# Altium footprint library cool_library.PcbLib: 1182 footprints (part 30 of 75)
Each footprint in its own frame and in the unit in brackets; x right, y up, seen from the top. Pads: shape width x height; smd on the part's side, far side on the other; paste and mask are expansions set on the pad; w line width, h text height; cw(c..) or ccw(c..) is an arc to the next point about the centre after c.
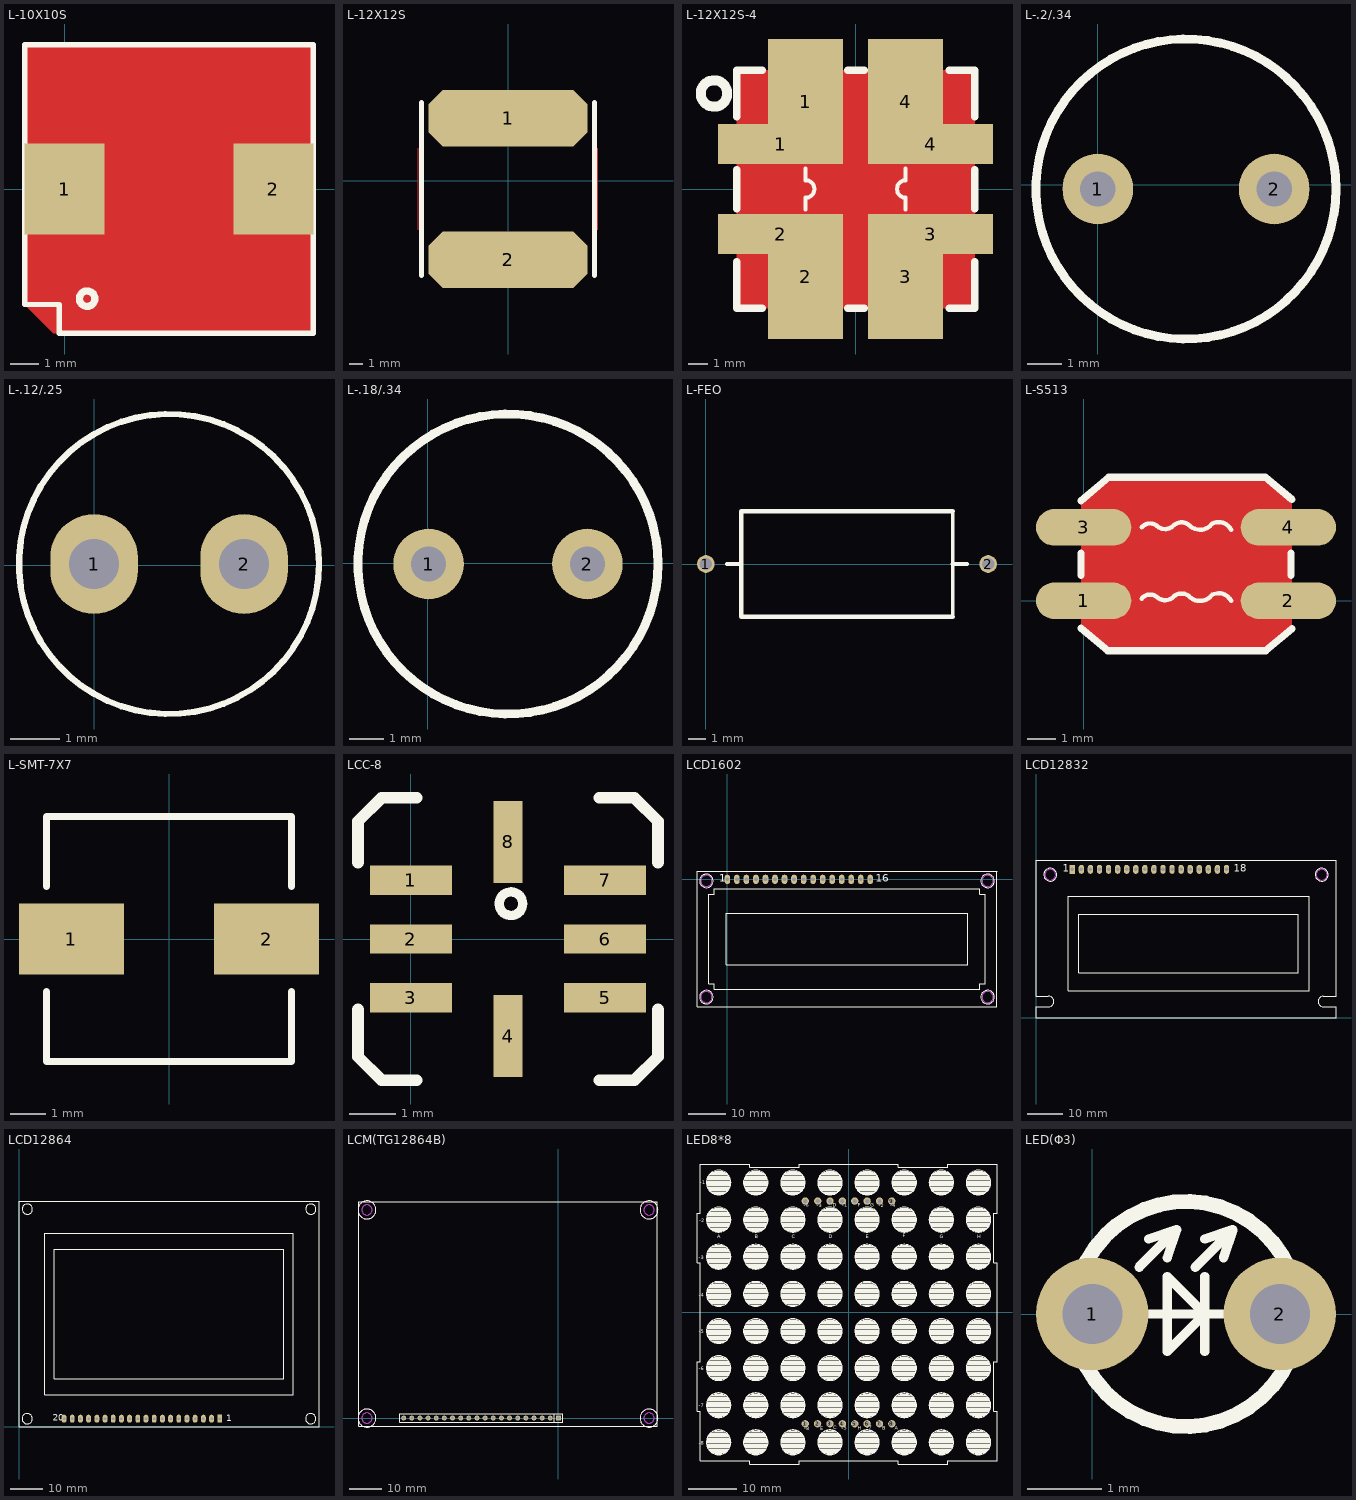
[diagram p29: the footprints below, top view; thin cyan lines are the x and y axes]

## L-10X10S [mm]
pads (2):
  rect 2.8x3.2 smd: 1(0,0) 2(7.3,0)
Top Layer:
  pour cut-out: -1.4,5.05 8.7,5.05 8.7,-5.05 -0.393,-5.05 -1.4,-4.043
Top Overlay:
  circle w0.254: c0.784,-3.84 r0.27
  lines w0.178: -1.4,-4.043 -1.4,5.05 8.7,5.05 8.7,-5.05 -0.19,-5.05 -0.19,-4.043 -1.4,-4.043

## L-12X12S [mil]
pads (2):
  oct 450x160 smd: 1(0,177) 2(0,-223)
Top Layer:
  lines w2: -254,-138 -254,92 ; 254,-138 254,92
Top Overlay:
  lines w15: -245,-268 -245,222 ; 245,-268 245,222

## L-12X12S-4 [mil]
pads (8):
  rect 250x80 smd: 1(-150,90) 2(-150,-90) 3(150,-90) 4(150,90)
  rect 150x250 smd: 1(-100,175) 2(-100,-175) 3(100,-175) 4(100,175)
Top Layer:
  pour cut-out: -238,238 238,238 238,-238 -238,-238
Top Overlay:
  circle w20: c-283.48,191 r26.48
  lines w8: -100,-41.46 -100,-17.46 ccw(c-100,0) -100,17.46 -100,41.46 ; 100,-41.46 100,-17.46 cw(c100,0) 100,17.46 100,41.46
  lines w15: -238,-145 -238,-238 -187,-238 ; -238,-39 -238,39 ; -238,145 -238,238 -187,238 ; -16,-238 17,-238 ; -16,238 17,238 ; 187,-238 238,-238 238,-145 ; 187,238 238,238 238,145 ; 238,-39 238,39

## L-.2/.34 [mil]
pads (2):
  round 80 hole 40: 1(0,-5) 2(200,-5)
Top Overlay:
  circle w10: c100,-5 r170

## L-.12/.25 [mil]
pads (2):
  oval 70x80 hole 40: 1(0,1) 2(120,1)
Top Overlay:
  circle w5: c60,1 r120

## L-.18/.34 [mil]
pads (2):
  round 80 hole 40: 1(1,-1) 2(181,-1)
Top Overlay:
  circle w10: c91,-1 r170

## L-FEO [mm]
pads (2):
  round 1 hole 0.7: 1(0,0) 2(16,0)
Top Overlay:
  lines w0.2: 14,-3 14,3
  lines w0.254: 1.2,0 2,0 ; 14,-3 2,-3 2,3 14,3 ; 14,0 14.8,0

## L-S513 [mil]
pads (4):
  oval 130x50 smd: 1(0,0) 2(279,0) 3(0,100) 4(279,100)
Top Layer:
  pour cut-out: -3.59,136.41 34.22,168.22 247.78,168.22 284,138 284,-38 248,-68 33,-68 -3.59,-37.41
Top Overlay:
  lines w6: 79,3 cw(c90.5,-6.5) 100,5 ccw(c111,17) 123,6 cw(c133.5,-6.5) 146,4 ccw(c158.5,20.5) 175,8 cw(c184,-9) 201,0 ; 79,100 cw(c90.5,90.5) 100,102 ccw(c111,114) 123,103 cw(c133.5,90.5) 146,101 ccw(c158.5,117.5) 175,105 cw(c184,88) 201,97
  lines w10: -3.59,35 -3.59,65 ; 49,-68 33,-68 ; 55,168.22 34.22,168.22 ; 235,-68 248,-68 ; 237,168.22 247.78,168.22 ; 238,-68 248,-68 ; 282.59,35 282.59,65 ; 33,-68 -3.59,-37.41 33,-68 ; 33,-68 248,-68 ; 34.22,168.22 -3.59,136.41 34.22,168.22 ; 34.22,168.22 247.78,168.22 ; 247.78,168.22 284,138 247.78,168.22 ; 248,-68 284,-38 248,-68

## L-SMT-7X7 [mil]
height 324
pads (2):
  rect 118.11x80 smd: 1(-110,0) 2(110,0)
Top Overlay:
  lines w7.87: -137.79,-59.05 -137.79,-137.79 137.8,-137.79 137.8,-59.05 ; -137.79,59.06 -137.79,137.8 137.8,137.8 137.8,59.06

## LCC-8 [mil]
pads (8):
  rect 70x25 smd: 1(0,50) 2(0,0) 3(0,-50) 5(165,-50) 6(165,0) 7(165,50)
  rect 25x70 smd: 4(82.5,-82.5) 8(82.5,82.5)
Top Overlay:
  circle w8: c85,30 r10
  lines w10: -45,-60 -45,-100 -25,-120 5,-120 ; -45,65 -45,100 -25,120 5,120 ; 160,-120 190,-120 210,-100 210,-60 ; 160,120 190,120 210,100 210,65

## LCD1602 [mm]
pads (16):
  oval 1.5x2.5 hole 1: 1(0,0) 2(2.54,0) 3(5.08,0) 4(7.62,0) 5(10.16,0) 6(12.7,0) 7(15.24,0) 8(17.78,0) 9(20.32,0) 10(22.86,0) 11(25.4,0) 12(27.94,0) 13(30.48,0) 14(33.02,0) 15(35.56,0) 16(38.1,0)
Top Overlay:
  circle w0.2: c69.4,-0.4 r1.8
  circle w0.2: c69.4,-31.4 r1.8
  circle w0.2: c-5.6,-0.4 r1.8
  circle w0.2: c-5.6,-31.4 r1.8
  lines w0.203: -8.1,-33.9 -8.1,2.1 71.9,2.1 71.9,-33.9 -8.1,-33.9 ; -4.95,-27.8 -3.45,-27.8 -3.45,-29.3 67.25,-29.3 67.25,-27.8 68.75,-27.8 68.75,-4 67.25,-4 67.25,-2.5 -3.45,-2.5 -3.45,-4 -4.95,-4 -4.95,-27.8 ; -0.35,-22.8 -0.35,-9 64.15,-9 64.15,-22.8 -0.35,-22.8
  text "16" at 39.525,-0.694 h2
  text "1" at -2.131,-0.694 h2
Keep-Out Layer:
  circle w0.2: c69.4,-0.4 r1.5
  circle w0.2: c69.4,-31.4 r1.5
  circle w0.2: c-5.6,-0.4 r1.5
  circle w0.2: c-5.6,-31.4 r1.5
Mechanical 1:
  circle w0.2: c69.4,-0.4 r1.5
  circle w0.2: c69.4,-31.4 r1.5
  circle w0.2: c-5.6,-31.4 r1.5
  circle w0.2: c-5.6,-0.4 r1.5

## LCD12832 [mm]
pads (18):
  rect 1.5x2.5 hole 1: 1(10.16,41.5)
  oval 1.5x2.5 hole 1: 2(12.7,41.5) 3(15.24,41.5) 4(17.78,41.5) 5(20.32,41.5) 6(22.86,41.5) 7(25.4,41.5) 8(27.94,41.5) 9(30.48,41.5) 10(33.02,41.5) 11(35.56,41.5) 12(38.1,41.5) 13(40.64,41.5) 14(43.18,41.5) 15(45.72,41.5) 16(48.26,41.5) 17(50.8,41.5) 18(53.34,41.5)
Top Overlay:
  circle w0.254: c4,40 r1.8
  circle w0.254: c80,40 r1.8
  lines w0.203: 3.5,3 0,3 0,0 84,0 84,3 80.5,3 ; 3.5,6 0,6 0,44 84,44 84,6 80.5,6 ; 76.5,33.936 76.5,7.5 9,7.5 9,34 76.5,34 ; 12,12.5 73.5,12.5 73.5,29 12,29 12,12.5
  lines w0.254: 3.5,3 ccw(c3.5,4.5) 3.5,6 ; 80.5,3 cw(c80.5,4.5) 80.5,6
  text "1" at 7.493,40.894 h2
  text "18" at 55.372,40.894 h2
Keep-Out Layer:
  circle w0.254: c4,40 r1.5
  circle w0.254: c80,40 r1.5
Mechanical 1:
  circle w0.254: c4,40 r1.5
  circle w0.254: c80,40 r1.5

## LCD12864 [mm]
pads (20):
  rect 1.5x2.5 hole 0.8: 1(62.228,2.54)
  oval 1.5x2.5 hole 0.8: 2(59.688,2.54) 3(57.148,2.54) 4(54.608,2.54) 5(52.068,2.54) 6(49.528,2.54) 7(46.988,2.54) 8(44.448,2.54) 9(41.908,2.54) 10(39.368,2.54) 11(36.828,2.54) 12(34.288,2.54) 13(31.748,2.54) 14(29.208,2.54) 15(26.668,2.54) 16(24.128,2.54) 17(21.588,2.54) 18(19.048,2.54) 19(16.508,2.54) 20(13.968,2.54)
Top Overlay:
  lines w0.203: 0,0 93,0 93,70 0,70 0,0 ; 8,10 8,60 85,60 85,10 8,10 ; 11,15 11,55 82,55 82,15 11,15
  lines w0.254: 4.139,2.498 cw(c2.54,2.54) 4.14,2.54 ; 4.179,67.458 cw(c2.58,67.5) 4.18,67.5 ; 92.023,2.498 cw(c90.424,2.54) 92.024,2.54 ; 92.063,67.458 cw(c90.464,67.5) 92.064,67.5
  text "20" at 10.414,1.905 h2
  text "1" at 64.262,1.778 h2

## LCM(TG12864B) [mil]
pads (20):
  rect 60x60 hole 36: 1(0,0)
  round 60 hole 36: 2(-100,0) 3(-200,0) 4(-300,0) 5(-400,0) 6(-500,0) 7(-600,0) 8(-700,0) 9(-800,0) 10(-900,0) 11(-1000,0) 12(-1100,0) 13(-1200,0) 14(-1300,0) 15(-1400,0) 16(-1500,0) 17(-1600,0) 18(-1700,0) 19(-1800,0) 20(-1900,0)
Top Overlay:
  circle w10: c1112,-1 r110.24
  circle w10: c-2350,-1 r110.24
  circle w10: c1112,2555 r110.24
  circle w10: c-2350,2555 r110.24
  lines w8: -2450,-101 1212,-101 1212,2655 -2450,2655 -2450,-101
  lines w10: -50,-50 -50,50 ; -1950,-50 -1950,50 50,50 50,-50 -1950,-50
Keep-Out Layer:
  circle w10: c-2350,2555 r110.24
  circle w10: c-2350,-1 r110.24
  circle w10: c1112,-1 r110.24
  circle w10: c1112,2555 r110.24
  circle w10: c-2350,2555 r62.99
  circle w10: c-2350,-1 r62.99
  circle w10: c1112,-1 r62.99
  circle w10: c1112,2555 r62.99
Mechanical 1:
  circle w10: c-2350,2555 r62.99
  circle w10: c-2350,-1 r62.99
  circle w10: c1112,-1 r62.99
  circle w10: c1112,2555 r62.99

## LED8*8 [mm]
pads (16):
  round 1.5 hole 0.9: 1(-8.89,-22.86) 2(-6.35,-22.86) 3(-3.81,-22.86) 4(-1.27,-22.86) 5(1.27,-22.86) 6(3.81,-22.86) 7(6.35,-22.86) 8(8.89,-22.86) 9(8.89,22.86) 10(6.35,22.86) 11(3.81,22.86) 12(1.27,22.86) 13(-1.27,22.86) 14(-3.81,22.86) 15(-6.325,22.885) 16(-8.89,22.86)
Top Overlay:
  drawing of 1508 lines, arcs and shapes, not listed
  text "-6" at -9.22,21.692 h0.76
  text "-3" at -6.502,21.641 h0.76
  text "D" at -3.2,21.692 h0.76
  text "-1" at -1.321,21.717 h0.76
  text "F" at 1.905,21.717 h0.76
  text "G" at 4.47,21.742 h0.76
  text "-2" at 6.223,21.641 h0.76
  text "-4" at 8.585,21.615 h0.76
  text "-8" at -9.119,-24.206 h0.76
  text "E" at -5.791,-24.155 h0.76
  text "C" at -3.175,-24.028 h0.76
  text "-5" at -1.422,-24.13 h0.76
  text "H" at 1.854,-24.13 h0.76
  text "-7" at 3.759,-24.028 h0.76
  text "B" at 6.883,-24.13 h0.76
  text "A" at 9.474,-24.105 h0.76
  text "-1" at -30.48,26.365 h0.76
  text "-2" at -30.683,18.542 h0.76
  text "-3" at -30.734,10.973 h0.76
  text "-4" at -30.759,3.251 h0.76
  text "-5" at -30.785,-4.242 h0.76
  text "-6" at -30.734,-11.862 h0.76
  text "-7" at -30.759,-19.482 h0.76
  text "-8" at -30.785,-27.127 h0.76
  text "A" at -27,15.265 h0.76
  text "B" at -19.304,15.215 h0.76
  text "C" at -11.684,15.24 h0.76
  text "D" at -4.064,15.215 h0.76
  text "E" at 3.505,15.265 h0.76
  text "F" at 11.151,15.418 h0.76
  text "G" at 18.771,15.24 h0.76
  text "H" at 26.391,15.24 h0.76

## LED(Φ3) [mil]
pads (2):
  round 60 hole 32: 1(0,0) 2(100,0)
Top Overlay:
  circle w8: c50,0 r60
  lines w5: 25,25 45,45 ; 30,0 70,0 ; 30,40 45,45 ; 40,30 45,45 ; 55,25 75,45 ; 60,-20 60,20 ; 60,40 75,45 ; 70,30 75,45 ; 40,-20 60,0 40,20 40,-20